# Altium footprint library EthernetConnectors.PcbLib: 15 footprints
Each footprint in its own frame and in the unit in brackets; x right, y up, seen from the top. Pads: shape width x height; smd on the part's side, far side on the other; paste and mask are expansions set on the pad; w line width, h text height; cw(c..) or ccw(c..) is an arc to the next point about the centre after c.
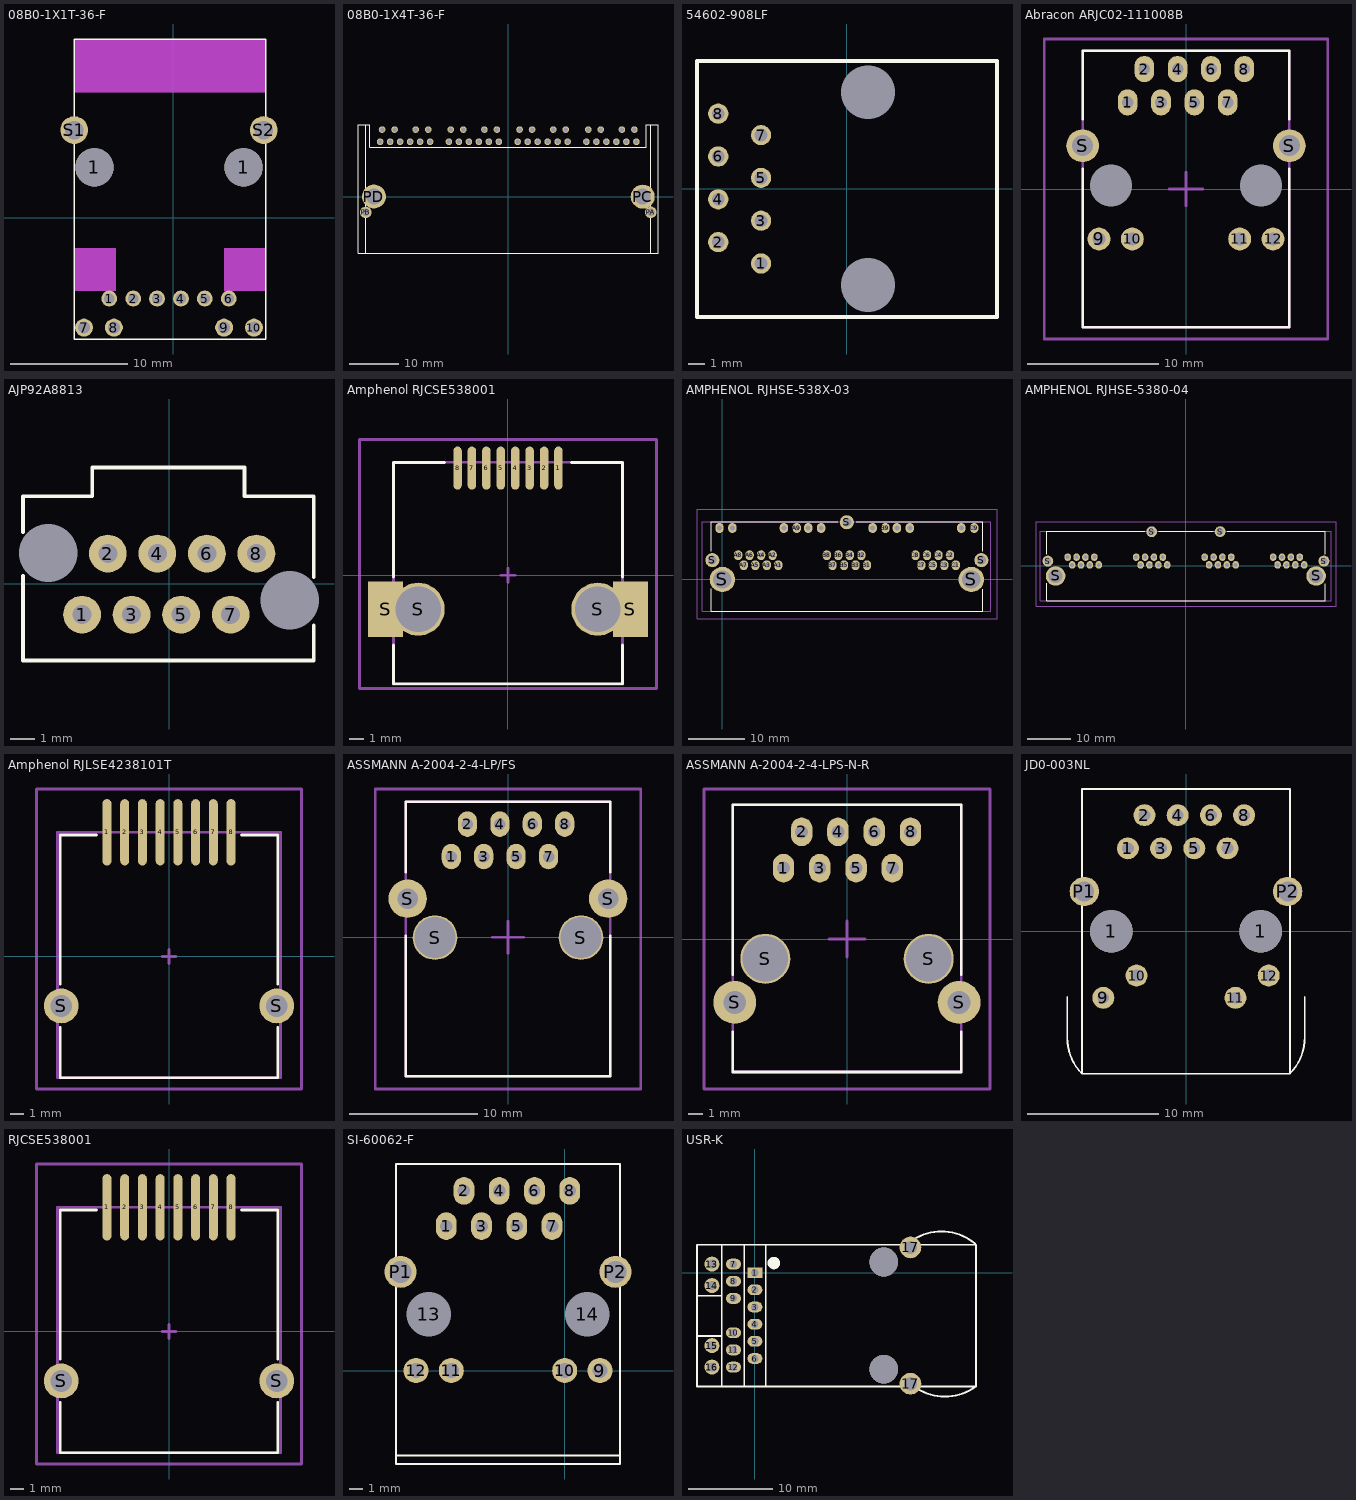
[diagram p0: the footprints below, top view; thin cyan lines are the x and y axes]

## 08B0-1X1T-36-F [mil] "RJ45-ETHERNET-MAGNETICS"
pads (14):
  round 127.95 hole 127.95: 1(-265,169.76) 1(235,169.76)
  round 53.15 hole 35.43: 1(-215,-270) 2(-135,-270) 3(-55,-270) 4(25,-270) 5(105,-270) 6(185,-270)
  round 60 hole 40: 7(-299.65,-367.24) 8(-199.65,-367.24) 9(169.65,-367.24) 10(269.65,-367.24)
  round 92.72 hole 61.81: S1(-332.52,294.57) S2(302.52,294.57)
Top Overlay:
  lines w5: -332.52,-405.43 309.61,-405.43 309.61,599.69 -332.52,599.69 -332.52,-405.43
Mechanical 8 keep-out:
  rectangle: -332.32,419.76 310,599.69
  rectangle: 170.04,-244.88 310,-100
  rectangle: -332.5,-244.88 -192.54,-100
3D body "User Library-08B0-1X1T-36-F-1.step": height 612.37, standoff -130.31, extent -423.45,-418.19 395,608.19

## 08B0-1X4T-36-F [mm] "TERM_BLOCK_8POS_H"
pads (44):
  round 1.35 hole 0.9: A1(26.06,11.2) A2(24.03,11.2) A3(22,11.2) A4(19.97,11.2) A5(17.94,11.2) A6(15.91,11.2) A7(25.67,13.66) A8(23.13,13.66) A9(18.84,13.66) A10(16.3,13.66) B1(12.09,11.2) B2(10.06,11.2) B3(8.03,11.2) B4(6,11.2) B5(3.97,11.2) B6(1.94,11.2) B7(11.7,13.66) B8(9.16,13.66) B9(4.87,13.66) B10(2.33,13.66) C1(-1.88,11.2) C2(-3.91,11.2) C3(-5.94,11.2) C4(-7.97,11.2) C5(-10,11.2) C6(-12.03,11.2) C7(-2.27,13.66) C8(-4.81,13.66) C9(-9.1,13.66) C10(-11.64,13.66) D1(-15.85,11.2) D2(-17.88,11.2) D3(-19.91,11.2) D4(-21.94,11.2) D5(-23.97,11.2) D6(-26,11.2) D7(-16.24,13.66) D8(-18.78,13.66) D9(-23.07,13.66) D10(-25.61,13.66)
  round 2.355 hole 1.57: PA(28.98,-3.15) PB(-28.93,-3.16)
  round 4.875 hole 3.25: PC(27.35,0.03) PD(-27.27,0.04)
Top Overlay:
  lines w0.127: -28.925,-11.43 -28.925,14.605 ; 28.987,-11.43 28.987,14.605 ; -30.5,-11.43 30.46,-11.43 30.46,14.605 28.04,14.605 28.04,10.07 -28.09,10.07 -28.09,14.605 -30.5,14.605 -30.5,-11.43
3D body "08B0-1X4T_colored.stp": height 14.95, standoff -3.05, extent -30.403,-11.493 30.48,14.541

## 54602-908LF [mm]
pads (10):
  round 1.2 hole 0.76: 1(-5.08,-4.445) 2(-7.62,-3.175) 3(-5.08,-1.905) 4(-7.62,-0.635) 5(-5.08,0.635) 6(-7.62,1.905) 7(-5.08,3.175) 8(-7.62,4.445)
  round 0 hole 3.2 unplated: 4(1.27,-5.715) 4(1.27,5.715)
Top Overlay:
  lines w0.254: -8.88,-7.625 -8.88,7.575 8.92,7.575 8.92,-7.625 -8.88,-7.625
3D body "54602-908LFc.stp": height 12.71, standoff -3.49, extent -8.814,-7.65 8.926,7.65

## Abracon ARJC02-111008B [mm]
height 13.55
pads (16):
  oval 1.5x2 hole 0.9: 1(-4.445,6.6) 2(-3.175,9.14) 3(-1.905,6.6) 4(-0.635,9.14) 5(0.635,6.6) 6(1.905,9.14) 7(3.175,6.6) 8(4.445,9.14)
  round 1.75 hole 1.02: 9(-6.63,-3.81) 10(-4.09,-3.81) 11(4.09,-3.81) 12(6.63,-3.81)
  round 0 hole 3.2 unplated: M(-5.715,0.25) M(5.715,0.25)
  round 2.5 hole 1.6: S(-7.875,3.3) S(7.875,3.3)
Top Overlay:
  lines w0.2: -7.874,1.52 -7.874,-10.545 0,-10.545 7.874,-10.545 7.874,1.52 ; -7.874,5.33 -7.874,10.537 0,10.537 7.874,10.537 7.874,5.33
Mechanical 1:
  lines w0.2: -7.874,-10.545 -7.874,10.537 7.874,10.537 7.874,-10.545 -7.874,-10.545
Mechanical 15:
  lines w0.2: -1.27,0 1.27,0 ; 0,-1.27 0,1.27 ; -10.795,-11.43 -10.795,11.43 10.795,11.43 10.795,-11.43 -10.795,-11.43
3D body "Abracon ARJC02-111008B.STEP": height 16.07, standoff -3.7, extent -10.336,-10.555 10.336,10.546

## AJP92A8813 [mil]
pads (10):
  round 60 hole 30: 1(-138.22,-49) 2(-97.22,48) 3(-59.48,-49) 4(-18.48,48) 5(19.26,-49) 6(60.26,48) 7(98,-49) 8(139,48)
  round 0 hole 92.91: H(-192,49) H(192,-26)
Top Overlay:
  lines w5.91: -232,13 -232,-122 229,-122 230,-122 230,-66 ; -232,82 -232,139 -122,139 -122,185 ; -53,185 -122,185 ; 230,11 230,139 120,139 120,185 -122,185
3D body "User Library-3D-Data_AJP92A8813.step": height 433.57, standoff -129.42, extent -231.31,-121.99 229.32,185.09

## Amphenol RJCSE538001 [mm]
height 13.46
pads (12):
  oval 0.6x3.05 smd: 1(3.57,7.58) 2(2.55,7.58) 3(1.53,7.58) 4(0.51,7.58) 5(-0.51,7.58) 6(-1.53,7.58) 7(-2.55,7.58) 8(-3.57,7.58)
  rect 2.5x3.9 smd: S(-8.66,-2.4) S(8.66,-2.4)
  round 3.75 hole 3.25: S(-6.35,-2.4) S(6.35,-2.4)
Top Overlay:
  lines w0.2: -8.1,-4.92 -8.1,-7.67 0,-7.67 8.1,-7.67 8.1,-4.92 ; -8.1,-0.12 -8.1,7.98 -4.5,7.98 ; 4.5,7.98 8.1,7.98 8.1,-0.12
Mechanical 13:
  lines w0.2: -8.1,-7.7 8.1,-7.7 8.1,8 -8.1,8 -8.1,-7.7
Mechanical 15:
  lines w0.2: -0.5,0 0.5,0 ; 0,-0.5 0,0.5 ; -10.5,-8 -10.5,9.6 10.5,9.6 10.5,-8 -10.5,-8
3D body "Amphenol RJCSE538001.STEP": height 14.77, standoff -1.27, extent -9.43,-7.66 9.43,8.875

## AMPHENOL RJHSE-538X-03 [mm]
height 13.46
pads (41):
  oval 1.5x1.75 hole 0.9: A1(9.93,2.54) A2(8.91,4.32) A3(7.89,2.54) A4(6.87,4.32) A5(5.85,2.54) A6(4.83,4.32) A7(3.81,2.54) A8(2.79,4.32) A9(13.21,9.14) A10(10.92,9.14) A11(1.78,9.14) A12(-0.51,9.14) B1(25.68,2.54) B2(24.66,4.32) B3(23.64,2.54) B4(22.62,4.32) B5(21.6,2.54) B6(20.58,4.32) B7(19.56,2.54) B8(18.54,4.32) B9(28.96,9.14) B10(26.67,9.14) B11(17.53,9.14) B12(15.24,9.14) C1(41.43,2.54) C2(40.41,4.32) C3(39.39,2.54) C4(38.37,4.32) C5(37.35,2.54) C6(36.33,4.32) C7(35.31,2.54) C8(34.29,4.32) C9(44.71,9.14) C10(42.42,9.14) C11(33.28,9.14) C12(30.99,9.14)
  round 2.5 hole 1.57: S(-1.78,3.43) S(22.1,10.16) S(45.98,3.43)
  round 4.5 hole 3.25: S(0,0) S(44.2,0)
Top Overlay:
  lines w0.2: -2,-1.675 -2,-5.65 46.25,-5.65 ; -2,5 -2,10.25 20.5,10.25 ; 23.75,10.25 46.25,10.25 ; 46.26,-5.65 46.26,-1.75 ; 46.26,5 46.26,10.25 ; 20.5,10.25 20.5,10.25
Mechanical 1:
  lines w0.2: 47.67,10.25 -3.525,10.25 -3.525,-5.65 47.686,-5.65 47.686,10.235
Mechanical 15:
  lines w0.2: -4.5,-7 48.76,-7 48.76,12.5 -4.5,12.5 -4.5,-7
3D body "Amphenol RJHSE-538X-03-REVT1.STEP": height 14.47, standoff -4.44, extent -3.345,-6.108 47.825,10.481

## AMPHENOL RJHSE-5380-04 [mm]
height 13.46
pads (38):
  oval 1.5x1.75 hole 0.9: A1(-20.04,0.24) A2(-21.06,2.02) A3(-22.08,0.24) A4(-23.1,2.02) A5(-24.12,0.24) A6(-25.14,2.02) A7(-26.16,0.24) A8(-27.18,2.02) B1(-4.29,0.24) B2(-5.31,2.02) B3(-6.33,0.24) B4(-7.35,2.02) B5(-8.37,0.24) B6(-9.39,2.02) B7(-10.41,0.24) B8(-11.43,2.02) C1(11.46,0.24) C2(10.44,2.02) C3(9.42,0.24) C4(8.4,2.02) C5(7.38,0.24) C6(6.36,2.02) C7(5.34,0.24) C8(4.32,2.02) D1(27.21,0.24) D2(26.19,2.02) D3(25.17,0.24) D4(24.15,2.02) D5(23.13,0.24) D6(22.11,2.02) D7(21.09,0.24) D8(20.07,2.02)
  round 2.5 hole 1.57: S(-31.75,1.13) S(-7.87,7.86) S(7.88,7.89) S(31.75,1.13)
  round 4.5 hole 3.25: S(-29.97,-2.3) S(29.97,-2.3)
Top Overlay:
  lines w0.2: -31.97,-3.975 -31.97,-7.95 32.03,-7.95 32.03,-4.05 ; -31.97,2.7 -31.97,7.95 -9.47,7.95 ; -6.22,7.95 6.28,7.95 ; 9.53,7.95 32.03,7.95 ; 32.03,2.7 32.03,7.95 ; -9.47,7.95 -9.47,7.95 ; 32.03,7.95 32.03,7.95
Mechanical 1:
  lines w0.2: -33.495,-7.95 33.456,-7.95 33.456,7.95 -33.495,7.95 -33.495,-7.95
Mechanical 15:
  lines w0.2: -34.47,-9.3 34.53,-9.3 34.53,10.2 -34.47,10.2 -34.47,-9.3
3D body "Amphenol RJHSE-5380-04-REVT1.STEP": height 14.68, standoff -4.17, extent -33.47,-8 33.481,7.9

## Amphenol RJLSE4238101T [mm] "Surface mount modular jack with shield"
height 11.93
pads (10):
  oval 0.64x4.75 smd: 1(-4.445,8.9) 2(-3.175,8.9) 3(-1.905,8.9) 4(-0.635,8.9) 5(0.635,8.9) 6(1.905,8.9) 7(3.175,8.9) 8(4.445,8.9)
  round 2.5 hole 1.57: S(-7.72,-3.545) S(7.72,-3.545)
Top Overlay:
  lines w0.2: -7.8,-5.1 -7.8,-8.7 0.6,-8.7 7.8,-8.7 7.8,-5.1 ; -7.8,-2 -7.8,8.7 -5.2,8.7 ; 5.2,8.7 7.8,8.7 7.8,-2
Mechanical 13:
  lines w0.2: -8,-8.7 -8,8.9 8,8.9 8,-8.7 -8,-8.7
Mechanical 15:
  lines w0.2: -0.5,0 0.5,0 ; 0,-0.5 0,0.5 ; -9.5,-9.5 -9.5,12 9.5,12 9.5,-9.5 0,-9.5 -9.5,-9.5
3D body "Amphenol RJLSE4238101T.STEP": height 11.76, standoff -2.19, extent -8.051,-8.701 8.049,9.863

## ASSMANN A-2004-2-4-LP/FS [mm]
height 13.3
pads (12):
  oval 1.5x2 hole 0.9: 1(-4.445,6.31) 2(-3.175,8.85) 3(-1.905,6.31) 4(-0.635,8.85) 5(0.635,6.31) 6(1.905,8.85) 7(3.175,6.31) 8(4.445,8.85)
  round 3 hole 1.6: S(-7.855,3.01) S(7.845,3.01)
  round 3.5 hole 3.2: S(-5.715,-0.04) S(5.715,-0.04)
Top Overlay:
  lines w0.2: -8,0.1 -8,-10.9 8,-10.9 8,0.1 ; -8,5.1 -8,10.6 8,10.6 8,5.1
Mechanical 1:
  lines w0.2: -8,-10.9 8,-10.9 8,10.6 -8,10.6 -8,-10.9
Mechanical 15:
  lines w0.2: -1.25,0 1.25,0 ; 0,-1.25 0,1.25 ; -10.4,-11.9 -10.4,11.6 10.4,11.6 10.4,-11.9 -10.4,-11.9
3D body "ASSMANN A-2004-2-4-LPFS-N-R.STEP": height 13.6, standoff -3.5, extent -8,-10.9 8,10.6

## ASSMANN A-2004-2-4-LPS-N-R [mm]
height 13.3
pads (12):
  oval 1.5x2 hole 0.9: 1(-4.445,4.96) 2(-3.175,7.5) 3(-1.905,4.96) 4(-0.635,7.5) 5(0.635,4.96) 6(1.905,7.5) 7(3.175,4.96) 8(4.445,7.5)
  round 3 hole 1.6: S(-7.855,-4.44) S(7.845,-4.44)
  round 3.5 hole 3.2: S(-5.715,-1.39) S(5.715,-1.39)
Top Overlay:
  lines w0.2: -8,-6.5 -8,-9.3 8,-9.3 8,-6.5 ; -8,-2.5 -8,9.4 8,9.4 8,-2.5
Mechanical 1:
  lines w0.2: -8,-9.3 8,-9.3 8,9.4 -8,9.4 -8,-9.3
Mechanical 15:
  lines w0.2: -1.25,0 1.25,0 ; 0,-1.25 0,1.25 ; -10,-10.5 10,-10.5 10,10.5 -10,10.5 -10,-10.5
3D body "ASSMANN A-2004-2-4-LPS-N-R.STEP": height 13.3, standoff -3.5, extent -8,-9.3 8,9.4

## JD0-003NL [mil]
pads (16):
  round 127.95 hole 127.95: 1(-225,0) 1(225,0)
  round 66 hole 35.43: 1(-175,250) 2(-125,350) 3(-75,250) 4(-25,350) 5(25,250) 6(75,350) 7(125,250) 8(175,350) 9(-249.02,-200) 10(-149.02,-133.07) 11(149.02,-200) 12(249.02,-133.07)
  round 88.59 hole 59.06: P1(-306.1,120.08) P2(306.1,120.08)
Top Overlay:
  lines w5: -357.28,-196.85 -357.28,-319.88 ccw(c-203.95,-321.32) -312.99,-429.13 ; 357.28,-196.85 357.28,-318.9 cw(c203.95,-320.34) 312.99,-428.15 ; 312.99,-428.15 312.99,-428.74 -312.99,-428.74 -312.99,428.74 312.99,428.74 312.99,-428.15
3D body "JD0-003NL.step": height 586.33, standoff -158.95, extent -381.13,-427 377.13,413.55

## RJCSE538001 [mm] "Surface mount modular jack with shield"
height 11.93
pads (10):
  oval 0.64x4.75 smd: 1(-4.445,8.9) 2(-3.175,8.9) 3(-1.905,8.9) 4(-0.635,8.9) 5(0.635,8.9) 6(1.905,8.9) 7(3.175,8.9) 8(4.445,8.9)
  round 2.5 hole 1.57: S(-7.72,-3.545) S(7.72,-3.545)
Top Overlay:
  lines w0.2: -7.8,-5.1 -7.8,-8.7 0.6,-8.7 7.8,-8.7 7.8,-5.1 ; -7.8,-2 -7.8,8.7 -5.2,8.7 ; 5.2,8.7 7.8,8.7 7.8,-2
Mechanical 13:
  lines w0.2: -8,-8.7 -8,8.9 8,8.9 8,-8.7 -8,-8.7
Mechanical 15:
  lines w0.2: -0.5,0 0.5,0 ; 0,-0.5 0,0.5 ; -9.5,-9.5 -9.5,12 9.5,12 9.5,-9.5 0,-9.5 -9.5,-9.5
3D body "M-RJCSE-5380-01-REVT1.STEP": height 14.69, standoff -1.35, extent -8.523,-5.677 10.336,10.858

## SI-60062-F [mm]
pads (16):
  oval 1.5x2 hole 0.9: 1(-8.53,10.41) 2(-7.26,12.95) 3(-5.99,10.41) 4(-4.72,12.95) 5(-3.45,10.41) 6(-2.18,12.95) 7(-0.91,10.41) 8(0.36,12.95)
  round 1.8 hole 1.1: 9(2.54,0) 10(0,0) 11(-8.17,0) 12(-10.71,0)
  round 2.5 hole 3.2 unplated: 13(-9.8,4.06) 14(1.63,4.06)
  round 2.3 hole 1.6: P1(-11.83,7.11) P2(3.66,7.11)
Top Overlay:
  lines w0.127: -12.141,-6.121 3.988,-6.121 ; -12.15,-6.73 3.98,-6.73 3.98,14.885 -12.15,14.885 -12.15,-6.73

## USR-K [mil]
pads (18):
  rect 70x50 hole 35: 1(0,0)
  oval 70x50 hole 35: 2(0,-80) 3(0,-160) 4(0,-240) 5(0,-320) 6(0,-400) 7(-100,40) 8(-100,-40) 9(-100,-120) 10(-100,-280) 11(-100,-360) 12(-100,-440)
  round 70 hole 43: 13(-200,40) 14(-200,-60) 15(-200,-340) 16(-200,-440)
  round 101.18 hole 61.81: 17(725,-517.5) 17(725,117.5)
via 600,-450 diameter 133.86 hole 133.86
via 600,50 diameter 133.86 hole 133.86
Top Overlay:
  circle w30: c88.46,45 r14.14
  lines w8: -269.8,130.71 -269.69,-530.71 1030.32,-530.71 1030.2,127.48 ; -269.69,130.71 1030.32,130.71 ; -265,-294.96 -160,-294.96 ; -264.61,-107.52 -154.8,-107.52 ; -155,-530.71 -155,130.71 ; -50,-530.71 -50,130.71 ; 50.2,-527.52 50.2,127.48
  lines w10: 726.59,145.57 cw(c869.47,-50.22) 1026.03,134.81 ; 729.36,-519.85 ccw(c885.92,-334.82) 1028.8,-530.61
3D body "User Library-WE-RJ45 LAN HPLE RJ45 LAN Transformer_799111614_WürthElektronik.step": height 586.61, standoff -157.48, extent -275,-591.14 1025,191.14